# Altium integrated library 860010374011_Altium_WCAP-ATG8_rev19a.IntLib: 195 symbols (part 2 of 2)
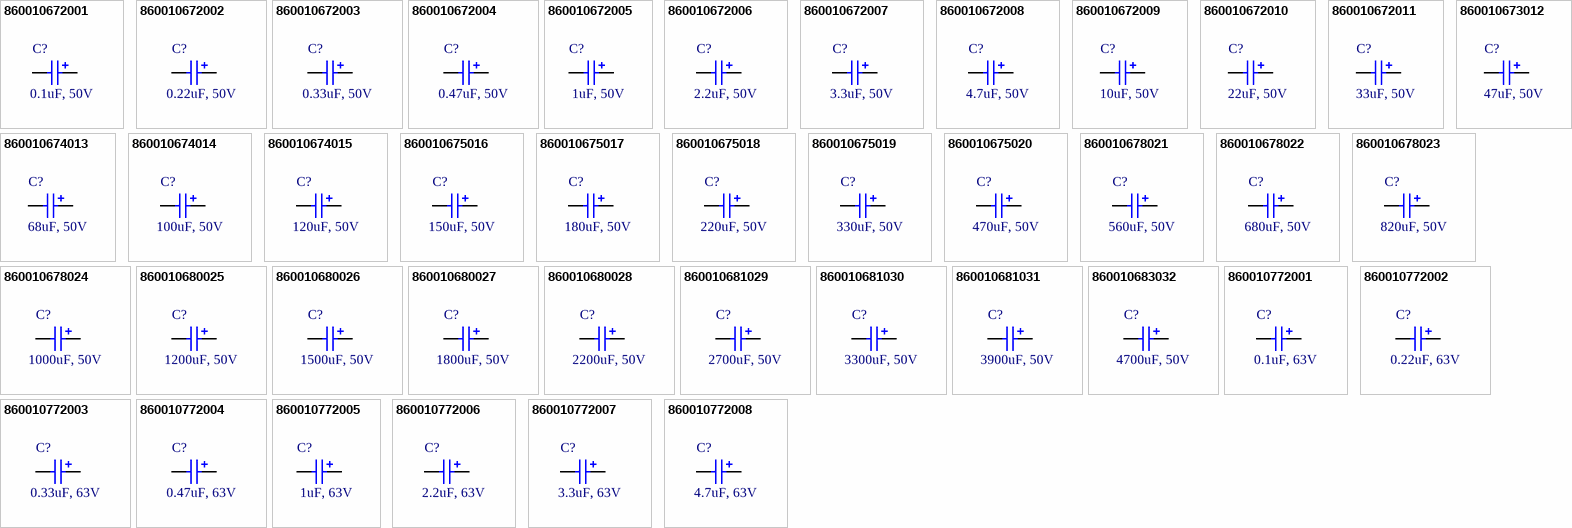
[diagram p5: symbols 860010672001 to 860010772008]

## 860010678024
designator C?, comment 1000uF, 50V
WCAP-ATG8 THT Aluminum Electrolytic Capacitors, D13mm x L25mm, 1000uF, +/-20%, 50VDC; Part Number: 860010678024; Dissipation Factor: 10%; Endurance: 2000h; Leakage Current: 500uA; Ripple Current max.: 1485mA; Technical Reference: ATBI250102M050DSPACB000; ComponentLink1Description: Manufacturer; ComponentLink1URL: http://www.we-online.de; ComponentLink2Description: Datasheet; ComponentLink2URL: https://katalog.we-online.com/pbs/datasheet/860010678024.pdf; Length: 25mm; Mounting Technology: THT; Operating Temperature: -40 to +85degC; Packaging: Ammo Pack; Published Date: August 2019; Capacitance: 1000uF; Diameter: 13mm; Publisher: Wurth Elektronik; Capacitance Tolerance: +/-20%; Rated Voltage: 50VDC
footprint WCAP-ATG8_13x25
pins: 1 N, 2 P

## 860010680025
designator C?, comment 1200uF, 50V
WCAP-ATG8 THT Aluminum Electrolytic Capacitors, D16mm x L25mm, 1200uF, +/-20%, 50VDC; Part Number: 860010680025; Dissipation Factor: 10%; Endurance: 2000h; Leakage Current: 600uA; Ripple Current max.: 1617mA; Technical Reference: ATBK250122M050DSPAEB000; ComponentLink1Description: Manufacturer; ComponentLink1URL: http://www.we-online.de; ComponentLink2Description: Datasheet; ComponentLink2URL: https://katalog.we-online.com/pbs/datasheet/860010680025.pdf; Length: 25mm; Mounting Technology: THT; Operating Temperature: -40 to +85degC; Packaging: Ammo Pack; Published Date: August 2019; Capacitance: 1200uF; Diameter: 16mm; Publisher: Wurth Elektronik; Capacitance Tolerance: +/-20%; Rated Voltage: 50VDC
footprint WCAP-ATG8_16x25
pins: 1 N, 2 P

## 860010680026
designator C?, comment 1500uF, 50V
WCAP-ATG8 THT Aluminum Electrolytic Capacitors, D16mm x L31.5mm, 1500uF, +/-20%, 50VDC; Part Number: 860010680026; Dissipation Factor: 10%; Endurance: 2000h; Leakage Current: 750uA; Ripple Current max.: 1848mA; Technical Reference: ATBK315152M050DSPADB000; ComponentLink1Description: Manufacturer; ComponentLink1URL: http://www.we-online.de; ComponentLink2Description: Datasheet; ComponentLink2URL: https://katalog.we-online.com/pbs/datasheet/860010680026.pdf; Length: 31.5mm; Mounting Technology: THT; Operating Temperature: -40 to +85degC; Packaging: Ammo Pack; Published Date: August 2019; Capacitance: 1500uF; Diameter: 16mm; Publisher: Wurth Elektronik; Capacitance Tolerance: +/-20%; Rated Voltage: 50VDC
footprint WCAP-ATG8_16x31.5
pins: 1 N, 2 P

## 860010680027
designator C?, comment 1800uF, 50V
WCAP-ATG8 THT Aluminum Electrolytic Capacitors, D16mm x L31.5mm, 1800uF, +/-20%, 50VDC; Part Number: 860010680027; Dissipation Factor: 10%; Endurance: 2000h; Leakage Current: 900uA; Ripple Current max.: 2112mA; Technical Reference: ATBK315182M050DSPADB000; ComponentLink1Description: Manufacturer; ComponentLink1URL: http://www.we-online.de; ComponentLink2Description: Datasheet; ComponentLink2URL: https://katalog.we-online.com/pbs/datasheet/860010680027.pdf; Length: 31.5mm; Mounting Technology: THT; Operating Temperature: -40 to +85degC; Packaging: Ammo Pack; Published Date: August 2019; Capacitance: 1800uF; Diameter: 16mm; Publisher: Wurth Elektronik; Capacitance Tolerance: +/-20%; Rated Voltage: 50VDC
footprint WCAP-ATG8_16x31.5
pins: 1 N, 2 P

## 860010680028
designator C?, comment 2200uF, 50V
WCAP-ATG8 THT Aluminum Electrolytic Capacitors, D16mm x L35.5mm, 2200uF, +/-20%, 50VDC; Part Number: 860010680028; Dissipation Factor: 12%; Endurance: 2000h; Leakage Current: 1100uA; Ripple Current max.: 2310mA; Technical Reference: ATBK355222M050DSPADB000; ComponentLink1Description: Manufacturer; ComponentLink1URL: http://www.we-online.de; ComponentLink2Description: Datasheet; ComponentLink2URL: https://katalog.we-online.com/pbs/datasheet/860010680028.pdf; Length: 35.5mm; Mounting Technology: THT; Operating Temperature: -40 to +85degC; Packaging: Ammo Pack; Published Date: August 2019; Capacitance: 2200uF; Diameter: 16mm; Publisher: Wurth Elektronik; Capacitance Tolerance: +/-20%; Rated Voltage: 50VDC
footprint WCAP-ATG8_16x35.5
pins: 1 N, 2 P

## 860010681029
designator C?, comment 2700uF, 50V
WCAP-ATG8 THT Aluminum Electrolytic Capacitors, D18mm x L31.5mm, 2700uF, +/-20%, 50VDC; Part Number: 860010681029; Dissipation Factor: 12%; Endurance: 2000h; Leakage Current: 1350uA; Ripple Current max.: 2420mA; Technical Reference: ATBL315272M050DSPAEB000; ComponentLink1Description: Manufacturer; ComponentLink1URL: http://www.we-online.de; ComponentLink2Description: Datasheet; ComponentLink2URL: https://katalog.we-online.com/pbs/datasheet/860010681029.pdf; Length: 31.5mm; Mounting Technology: THT; Operating Temperature: -40 to +85degC; Packaging: Ammo Pack; Published Date: August 2019; Capacitance: 2700uF; Diameter: 18mm; Publisher: Wurth Elektronik; Capacitance Tolerance: +/-20%; Rated Voltage: 50VDC
footprint WCAP-ATG8_18x31.5
pins: 1 N, 2 P

## 860010681030
designator C?, comment 3300uF, 50V
WCAP-ATG8 THT Aluminum Electrolytic Capacitors, D18mm x L35.5mm, 3300uF, +/-20%, 50VDC; Part Number: 860010681030; Dissipation Factor: 14%; Endurance: 2000h; Leakage Current: 1650uA; Ripple Current max.: 2750mA; Technical Reference: ATBL355332M050DSPAEB000; ComponentLink1Description: Manufacturer; ComponentLink1URL: http://www.we-online.de; ComponentLink2Description: Datasheet; ComponentLink2URL: https://katalog.we-online.com/pbs/datasheet/860010681030.pdf; Length: 35.5mm; Mounting Technology: THT; Operating Temperature: -40 to +85degC; Packaging: Ammo Pack; Published Date: August 2019; Capacitance: 3300uF; Diameter: 18mm; Publisher: Wurth Elektronik; Capacitance Tolerance: +/-20%; Rated Voltage: 50VDC
footprint WCAP-ATG8_18x35.5
pins: 1 N, 2 P

## 860010681031
designator C?, comment 3900uF, 50V
WCAP-ATG8 THT Aluminum Electrolytic Capacitors, D18mm x L41mm, 3900uF, +/-20%, 50VDC; Part Number: 860010681031; Dissipation Factor: 14%; Endurance: 2000h; Leakage Current: 1950uA; Ripple Current max.: 2871mA; Technical Reference: ATBL410392M050DSPS1B000; ComponentLink1Description: Manufacturer; ComponentLink1URL: http://www.we-online.de; ComponentLink2Description: Datasheet; ComponentLink2URL: https://katalog.we-online.com/pbs/datasheet/860010681031.pdf; Length: 41mm; Mounting Technology: THT; Operating Temperature: -40 to +85degC; Packaging: Ammo Pack; Published Date: August 2019; Capacitance: 3900uF; Diameter: 18mm; Publisher: Wurth Elektronik; Capacitance Tolerance: +/-20%; Rated Voltage: 50VDC
footprint WCAP-ATG8_18x41
pins: 1 N, 2 P

## 860010683032
designator C?, comment 4700uF, 50V
WCAP-ATG8 THT Aluminum Electrolytic Capacitors, D22mm x L41mm, 4700uF, +/-20%, 50VDC; Part Number: 860010683032; Dissipation Factor: 16%; Endurance: 2000h; Leakage Current: 2350uA; Ripple Current max.: 3355mA; Technical Reference: ATBN410472M050DSPS2B000; ComponentLink1Description: Manufacturer; ComponentLink1URL: http://www.we-online.de; ComponentLink2Description: Datasheet; ComponentLink2URL: https://katalog.we-online.com/pbs/datasheet/860010683032.pdf; Length: 41mm; Mounting Technology: THT; Operating Temperature: -40 to +85degC; Packaging: Ammo Pack; Published Date: August 2019; Capacitance: 4700uF; Diameter: 22mm; Publisher: Wurth Elektronik; Capacitance Tolerance: +/-20%; Rated Voltage: 50VDC
footprint WCAP-ATG8_22x41
pins: 1 N, 2 P

## 860010772001
designator C?, comment 0.1uF, 63V
WCAP-ATG8 THT Aluminum Electrolytic Capacitors, D5mm x L11mm, 0.1uF, +/-20%, 63VDC; Part Number: 860010772001; Dissipation Factor: 9%; Endurance: 2000h; Leakage Current: 3uA; Ripple Current max.: 4mA; Technical Reference: ATBC110R10M063DSPA3B000; ComponentLink1Description: Manufacturer; ComponentLink1URL: http://www.we-online.de; ComponentLink2Description: Datasheet; ComponentLink2URL: https://katalog.we-online.com/pbs/datasheet/860010772001.pdf; Length: 11mm; Mounting Technology: THT; Operating Temperature: -40 to +85degC; Packaging: Ammo Pack; Published Date: August 2019; Capacitance: 0.1uF; Diameter: 5mm; Publisher: Wurth Elektronik; Capacitance Tolerance: +/-20%; Rated Voltage: 63VDC
footprint WCAP-ATG8_5x11
pins: 1 N, 2 P

## 860010772002
designator C?, comment 0.22uF, 63V
WCAP-ATG8 THT Aluminum Electrolytic Capacitors, D5mm x L11mm, 0.22uF, +/-20%, 63VDC; Part Number: 860010772002; Dissipation Factor: 9%; Endurance: 2000h; Leakage Current: 3uA; Ripple Current max.: 4mA; Technical Reference: ATBC110R22M063DSPA3B000; ComponentLink1Description: Manufacturer; ComponentLink1URL: http://www.we-online.de; ComponentLink2Description: Datasheet; ComponentLink2URL: https://katalog.we-online.com/pbs/datasheet/860010772002.pdf; Length: 11mm; Mounting Technology: THT; Operating Temperature: -40 to +85degC; Packaging: Ammo Pack; Published Date: August 2019; Capacitance: 0.22uF; Diameter: 5mm; Publisher: Wurth Elektronik; Capacitance Tolerance: +/-20%; Rated Voltage: 63VDC
footprint WCAP-ATG8_5x11
pins: 1 N, 2 P

## 860010772003
designator C?, comment 0.33uF, 63V
WCAP-ATG8 THT Aluminum Electrolytic Capacitors, D5mm x L11mm, 0.33uF, +/-20%, 63VDC; Part Number: 860010772003; Dissipation Factor: 9%; Endurance: 2000h; Leakage Current: 3uA; Ripple Current max.: 6mA; Technical Reference: ATBC110R33M063DSPA3B000; ComponentLink1Description: Manufacturer; ComponentLink1URL: http://www.we-online.de; ComponentLink2Description: Datasheet; ComponentLink2URL: https://katalog.we-online.com/pbs/datasheet/860010772003.pdf; Length: 11mm; Mounting Technology: THT; Operating Temperature: -40 to +85degC; Packaging: Ammo Pack; Published Date: August 2019; Capacitance: 0.33uF; Diameter: 5mm; Publisher: Wurth Elektronik; Capacitance Tolerance: +/-20%; Rated Voltage: 63VDC
footprint WCAP-ATG8_5x11
pins: 1 N, 2 P

## 860010772004
designator C?, comment 0.47uF, 63V
WCAP-ATG8 THT Aluminum Electrolytic Capacitors, D5mm x L11mm, 0.47uF, +/-20%, 63VDC; Part Number: 860010772004; Dissipation Factor: 9%; Endurance: 2000h; Leakage Current: 3uA; Ripple Current max.: 8mA; Technical Reference: ATBC110R47M063DSPA3B000; ComponentLink1Description: Manufacturer; ComponentLink1URL: http://www.we-online.de; ComponentLink2Description: Datasheet; ComponentLink2URL: https://katalog.we-online.com/pbs/datasheet/860010772004.pdf; Length: 11mm; Mounting Technology: THT; Operating Temperature: -40 to +85degC; Packaging: Ammo Pack; Published Date: August 2019; Capacitance: 0.47uF; Diameter: 5mm; Publisher: Wurth Elektronik; Capacitance Tolerance: +/-20%; Rated Voltage: 63VDC
footprint WCAP-ATG8_5x11
pins: 1 N, 2 P

## 860010772005
designator C?, comment 1uF, 63V
WCAP-ATG8 THT Aluminum Electrolytic Capacitors, D5mm x L11mm, 1uF, +/-20%, 63VDC; Part Number: 860010772005; Dissipation Factor: 9%; Endurance: 2000h; Leakage Current: 3uA; Ripple Current max.: 17mA; Technical Reference: ATBC110010M063DSPA3B000; ComponentLink1Description: Manufacturer; ComponentLink1URL: http://www.we-online.de; ComponentLink2Description: Datasheet; ComponentLink2URL: https://katalog.we-online.com/pbs/datasheet/860010772005.pdf; Length: 11mm; Mounting Technology: THT; Operating Temperature: -40 to +85degC; Packaging: Ammo Pack; Published Date: August 2019; Capacitance: 1uF; Diameter: 5mm; Publisher: Wurth Elektronik; Capacitance Tolerance: +/-20%; Rated Voltage: 63VDC
footprint WCAP-ATG8_5x11
pins: 1 N, 2 P

## 860010772006
designator C?, comment 2.2uF, 63V
WCAP-ATG8 THT Aluminum Electrolytic Capacitors, D5mm x L11mm, 2.2uF, +/-20%, 63VDC; Part Number: 860010772006; Dissipation Factor: 9%; Endurance: 2000h; Leakage Current: 3uA; Ripple Current max.: 31mA; Technical Reference: ATBC1102R2M063DSPA3B000; ComponentLink1Description: Manufacturer; ComponentLink1URL: http://www.we-online.de; ComponentLink2Description: Datasheet; ComponentLink2URL: https://katalog.we-online.com/pbs/datasheet/860010772006.pdf; Length: 11mm; Mounting Technology: THT; Operating Temperature: -40 to +85degC; Packaging: Ammo Pack; Published Date: August 2019; Capacitance: 2.2uF; Diameter: 5mm; Publisher: Wurth Elektronik; Capacitance Tolerance: +/-20%; Rated Voltage: 63VDC
footprint WCAP-ATG8_5x11
pins: 1 N, 2 P

## 860010772007
designator C?, comment 3.3uF, 63V
WCAP-ATG8 THT Aluminum Electrolytic Capacitors, D5mm x L11mm, 3.3uF, +/-20%, 63VDC; Part Number: 860010772007; Dissipation Factor: 9%; Endurance: 2000h; Leakage Current: 3uA; Ripple Current max.: 39mA; Technical Reference: ATBC1103R3M063DSPA3B000; ComponentLink1Description: Manufacturer; ComponentLink1URL: http://www.we-online.de; ComponentLink2Description: Datasheet; ComponentLink2URL: https://katalog.we-online.com/pbs/datasheet/860010772007.pdf; Length: 11mm; Mounting Technology: THT; Operating Temperature: -40 to +85degC; Packaging: Ammo Pack; Published Date: August 2019; Capacitance: 3.3uF; Diameter: 5mm; Publisher: Wurth Elektronik; Capacitance Tolerance: +/-20%; Rated Voltage: 63VDC
footprint WCAP-ATG8_5x11
pins: 1 N, 2 P

## 860010772008
designator C?, comment 4.7uF, 63V
WCAP-ATG8 THT Aluminum Electrolytic Capacitors, D5mm x L11mm, 4.7uF, +/-20%, 63VDC; Part Number: 860010772008; Dissipation Factor: 9%; Endurance: 2000h; Leakage Current: 3uA; Ripple Current max.: 50mA; Technical Reference: ATBC1104R7M063DSPA3B000; ComponentLink1Description: Manufacturer; ComponentLink1URL: http://www.we-online.de; ComponentLink2Description: Datasheet; ComponentLink2URL: https://katalog.we-online.com/pbs/datasheet/860010772008.pdf; Length: 11mm; Mounting Technology: THT; Operating Temperature: -40 to +85degC; Packaging: Ammo Pack; Published Date: August 2019; Capacitance: 4.7uF; Diameter: 5mm; Publisher: Wurth Elektronik; Capacitance Tolerance: +/-20%; Rated Voltage: 63VDC
footprint WCAP-ATG8_5x11
pins: 1 N, 2 P

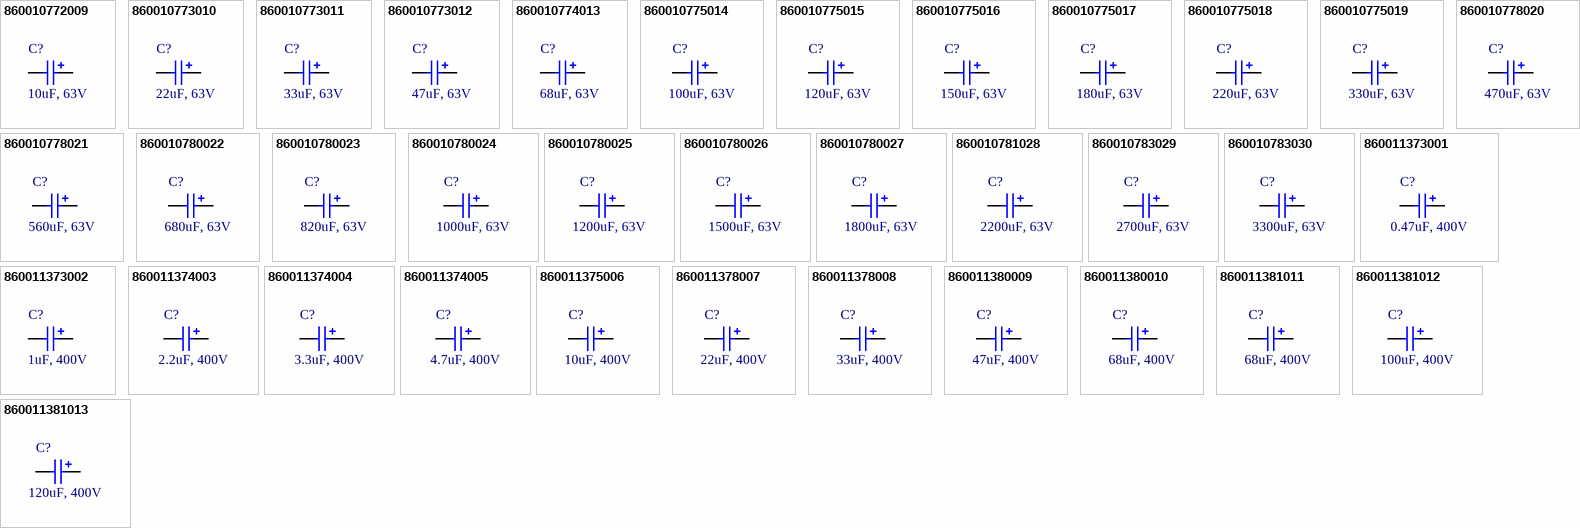
[diagram p4: symbols 860010772009 to 860011381013]

## 860010772009
designator C?, comment 10uF, 63V
WCAP-ATG8 THT Aluminum Electrolytic Capacitors, D5mm x L11mm, 10uF, +/-20%, 63VDC; Part Number: 860010772009; Dissipation Factor: 9%; Endurance: 2000h; Leakage Current: 6.3uA; Ripple Current max.: 77mA; Technical Reference: ATBC110100M063DSPA3B000; ComponentLink1Description: Manufacturer; ComponentLink1URL: http://www.we-online.de; ComponentLink2Description: Datasheet; ComponentLink2URL: https://katalog.we-online.com/pbs/datasheet/860010772009.pdf; Length: 11mm; Mounting Technology: THT; Operating Temperature: -40 to +85degC; Packaging: Ammo Pack; Published Date: August 2019; Capacitance: 10uF; Diameter: 5mm; Publisher: Wurth Elektronik; Capacitance Tolerance: +/-20%; Rated Voltage: 63VDC
footprint WCAP-ATG8_5x11
pins: 1 N, 2 P

## 860010773010
designator C?, comment 22uF, 63V
WCAP-ATG8 THT Aluminum Electrolytic Capacitors, D6.3mm x L11mm, 22uF, +/-20%, 63VDC; Part Number: 860010773010; Dissipation Factor: 9%; Endurance: 2000h; Leakage Current: 13.86uA; Ripple Current max.: 127mA; Technical Reference: ATBD110220M063DSPA4B000; ComponentLink1Description: Manufacturer; ComponentLink1URL: http://www.we-online.de; ComponentLink2Description: Datasheet; ComponentLink2URL: https://katalog.we-online.com/pbs/datasheet/860010773010.pdf; Length: 11mm; Mounting Technology: THT; Operating Temperature: -40 to +85degC; Packaging: Ammo Pack; Published Date: August 2019; Capacitance: 22uF; Diameter: 6.3mm; Publisher: Wurth Elektronik; Capacitance Tolerance: +/-20%; Rated Voltage: 63VDC
footprint WCAP-ATG8_6.3x11
pins: 1 N, 2 P

## 860010773011
designator C?, comment 33uF, 63V
WCAP-ATG8 THT Aluminum Electrolytic Capacitors, D6.3mm x L11mm, 33uF, +/-20%, 63VDC; Part Number: 860010773011; Dissipation Factor: 9%; Endurance: 2000h; Leakage Current: 20.79uA; Ripple Current max.: 149mA; Technical Reference: ATBD110330M063DSPA4B000; ComponentLink1Description: Manufacturer; ComponentLink1URL: http://www.we-online.de; ComponentLink2Description: Datasheet; ComponentLink2URL: https://katalog.we-online.com/pbs/datasheet/860010773011.pdf; Length: 11mm; Mounting Technology: THT; Operating Temperature: -40 to +85degC; Packaging: Ammo Pack; Published Date: August 2019; Capacitance: 33uF; Diameter: 6.3mm; Publisher: Wurth Elektronik; Capacitance Tolerance: +/-20%; Rated Voltage: 63VDC
footprint WCAP-ATG8_6.3x11
pins: 1 N, 2 P

## 860010773012
designator C?, comment 47uF, 63V
WCAP-ATG8 THT Aluminum Electrolytic Capacitors, D6.3mm x L11mm, 47uF, +/-20%, 63VDC; Part Number: 860010773012; Dissipation Factor: 9%; Endurance: 2000h; Leakage Current: 29.61uA; Ripple Current max.: 198mA; Technical Reference: ATBD110470M063DSPA4B000; ComponentLink1Description: Manufacturer; ComponentLink1URL: http://www.we-online.de; ComponentLink2Description: Datasheet; ComponentLink2URL: https://katalog.we-online.com/pbs/datasheet/860010773012.pdf; Length: 11mm; Mounting Technology: THT; Operating Temperature: -40 to +85degC; Packaging: Ammo Pack; Published Date: August 2019; Capacitance: 47uF; Diameter: 6.3mm; Publisher: Wurth Elektronik; Capacitance Tolerance: +/-20%; Rated Voltage: 63VDC
footprint WCAP-ATG8_6.3x11
pins: 1 N, 2 P

## 860010774013
designator C?, comment 68uF, 63V
WCAP-ATG8 THT Aluminum Electrolytic Capacitors, D8mm x L11.5mm, 68uF, +/-20%, 63VDC; Part Number: 860010774013; Dissipation Factor: 9%; Endurance: 2000h; Leakage Current: 42.84uA; Ripple Current max.: 253mA; Technical Reference: ATBE115680M063DSPA7B000; ComponentLink1Description: Manufacturer; ComponentLink1URL: http://www.we-online.de; ComponentLink2Description: Datasheet; ComponentLink2URL: https://katalog.we-online.com/pbs/datasheet/860010774013.pdf; Length: 11.5mm; Mounting Technology: THT; Operating Temperature: -40 to +85degC; Packaging: Ammo Pack; Published Date: August 2019; Capacitance: 68uF; Diameter: 8mm; Publisher: Wurth Elektronik; Capacitance Tolerance: +/-20%; Rated Voltage: 63VDC
footprint WCAP-ATG8_8x11.5
pins: 1 N, 2 P

## 860010775014
designator C?, comment 100uF, 63V
WCAP-ATG8 THT Aluminum Electrolytic Capacitors, D10mm x L12.5mm, 100uF, +/-20%, 63VDC; Part Number: 860010775014; Dissipation Factor: 9%; Endurance: 2000h; Leakage Current: 63uA; Ripple Current max.: 330mA; Technical Reference: ATBF125101M063DSPA9B000; ComponentLink1Description: Manufacturer; ComponentLink1URL: http://www.we-online.de; ComponentLink2Description: Datasheet; ComponentLink2URL: https://katalog.we-online.com/pbs/datasheet/860010775014.pdf; Length: 12.5mm; Mounting Technology: THT; Operating Temperature: -40 to +85degC; Packaging: Ammo Pack; Published Date: August 2019; Capacitance: 100uF; Diameter: 10mm; Publisher: Wurth Elektronik; Capacitance Tolerance: +/-20%; Rated Voltage: 63VDC
footprint WCAP-ATG8_10x12.5
pins: 1 N, 2 P

## 860010775015
designator C?, comment 120uF, 63V
WCAP-ATG8 THT Aluminum Electrolytic Capacitors, D10mm x L16mm, 120uF, +/-20%, 63VDC; Part Number: 860010775015; Dissipation Factor: 9%; Endurance: 2000h; Leakage Current: 75.6uA; Ripple Current max.: 396mA; Technical Reference: ATBF160121M063DSPAAB000; ComponentLink1Description: Manufacturer; ComponentLink1URL: http://www.we-online.de; ComponentLink2Description: Datasheet; ComponentLink2URL: https://katalog.we-online.com/pbs/datasheet/860010775015.pdf; Length: 16mm; Mounting Technology: THT; Operating Temperature: -40 to +85degC; Packaging: Ammo Pack; Published Date: August 2019; Capacitance: 120uF; Diameter: 10mm; Publisher: Wurth Elektronik; Capacitance Tolerance: +/-20%; Rated Voltage: 63VDC
footprint WCAP-ATG8_10x16
pins: 1 N, 2 P

## 860010775016
designator C?, comment 150uF, 63V
WCAP-ATG8 THT Aluminum Electrolytic Capacitors, D10mm x L16mm, 150uF, +/-20%, 63VDC; Part Number: 860010775016; Dissipation Factor: 9%; Endurance: 2000h; Leakage Current: 94.5uA; Ripple Current max.: 462mA; Technical Reference: ATBF160151M063DSPAAB000; ComponentLink1Description: Manufacturer; ComponentLink1URL: http://www.we-online.de; ComponentLink2Description: Datasheet; ComponentLink2URL: https://katalog.we-online.com/pbs/datasheet/860010775016.pdf; Length: 16mm; Mounting Technology: THT; Operating Temperature: -40 to +85degC; Packaging: Ammo Pack; Published Date: August 2019; Capacitance: 150uF; Diameter: 10mm; Publisher: Wurth Elektronik; Capacitance Tolerance: +/-20%; Rated Voltage: 63VDC
footprint WCAP-ATG8_10x16
pins: 1 N, 2 P

## 860010775017
designator C?, comment 180uF, 63V
WCAP-ATG8 THT Aluminum Electrolytic Capacitors, D10mm x L16mm, 180uF, +/-20%, 63VDC; Part Number: 860010775017; Dissipation Factor: 9%; Endurance: 2000h; Leakage Current: 113.4uA; Ripple Current max.: 528mA; Technical Reference: ATBF160181M063DSPAAB000; ComponentLink1Description: Manufacturer; ComponentLink1URL: http://www.we-online.de; ComponentLink2Description: Datasheet; ComponentLink2URL: https://katalog.we-online.com/pbs/datasheet/860010775017.pdf; Length: 16mm; Mounting Technology: THT; Operating Temperature: -40 to +85degC; Packaging: Ammo Pack; Published Date: August 2019; Capacitance: 180uF; Diameter: 10mm; Publisher: Wurth Elektronik; Capacitance Tolerance: +/-20%; Rated Voltage: 63VDC
footprint WCAP-ATG8_10x16
pins: 1 N, 2 P

## 860010775018
designator C?, comment 220uF, 63V
WCAP-ATG8 THT Aluminum Electrolytic Capacitors, D10mm x L16mm, 220uF, +/-20%, 63VDC; Part Number: 860010775018; Dissipation Factor: 9%; Endurance: 2000h; Leakage Current: 138.6uA; Ripple Current max.: 550mA; Technical Reference: ATBF160221M063DSPAAB000; ComponentLink1Description: Manufacturer; ComponentLink1URL: http://www.we-online.de; ComponentLink2Description: Datasheet; ComponentLink2URL: https://katalog.we-online.com/pbs/datasheet/860010775018.pdf; Length: 16mm; Mounting Technology: THT; Operating Temperature: -40 to +85degC; Packaging: Ammo Pack; Published Date: August 2019; Capacitance: 220uF; Diameter: 10mm; Publisher: Wurth Elektronik; Capacitance Tolerance: +/-20%; Rated Voltage: 63VDC
footprint WCAP-ATG8_10x16
pins: 1 N, 2 P

## 860010775019
designator C?, comment 330uF, 63V
WCAP-ATG8 THT Aluminum Electrolytic Capacitors, D10mm x L20mm, 330uF, +/-20%, 63VDC; Part Number: 860010775019; Dissipation Factor: 9%; Endurance: 2000h; Leakage Current: 207.9uA; Ripple Current max.: 759mA; Technical Reference: ATBF200331M063DSPAAB000; ComponentLink1Description: Manufacturer; ComponentLink1URL: http://www.we-online.de; ComponentLink2Description: Datasheet; ComponentLink2URL: https://katalog.we-online.com/pbs/datasheet/860010775019.pdf; Length: 20mm; Mounting Technology: THT; Operating Temperature: -40 to +85degC; Packaging: Ammo Pack; Published Date: August 2019; Capacitance: 330uF; Diameter: 10mm; Publisher: Wurth Elektronik; Capacitance Tolerance: +/-20%; Rated Voltage: 63VDC
footprint WCAP-ATG8_10x20
pins: 1 N, 2 P

## 860010778020
designator C?, comment 470uF, 63V
WCAP-ATG8 THT Aluminum Electrolytic Capacitors, D13mm x L20mm, 470uF, +/-20%, 63VDC; Part Number: 860010778020; Dissipation Factor: 9%; Endurance: 2000h; Leakage Current: 296.1uA; Ripple Current max.: 968mA; Technical Reference: ATBI200471M063DSPACB000; ComponentLink1Description: Manufacturer; ComponentLink1URL: http://www.we-online.de; ComponentLink2Description: Datasheet; ComponentLink2URL: https://katalog.we-online.com/pbs/datasheet/860010778020.pdf; Length: 20mm; Mounting Technology: THT; Operating Temperature: -40 to +85degC; Packaging: Ammo Pack; Published Date: August 2019; Capacitance: 470uF; Diameter: 13mm; Publisher: Wurth Elektronik; Capacitance Tolerance: +/-20%; Rated Voltage: 63VDC
footprint WCAP-ATG8_13x20
pins: 1 N, 2 P

## 860010778021
designator C?, comment 560uF, 63V
WCAP-ATG8 THT Aluminum Electrolytic Capacitors, D13mm x L25mm, 560uF, +/-20%, 63VDC; Part Number: 860010778021; Dissipation Factor: 9%; Endurance: 2000h; Leakage Current: 352.8uA; Ripple Current max.: 1056mA; Technical Reference: ATBI250561M063DSPACB000; ComponentLink1Description: Manufacturer; ComponentLink1URL: http://www.we-online.de; ComponentLink2Description: Datasheet; ComponentLink2URL: https://katalog.we-online.com/pbs/datasheet/860010778021.pdf; Length: 25mm; Mounting Technology: THT; Operating Temperature: -40 to +85degC; Packaging: Ammo Pack; Published Date: August 2019; Capacitance: 560uF; Diameter: 13mm; Publisher: Wurth Elektronik; Capacitance Tolerance: +/-20%; Rated Voltage: 63VDC
footprint WCAP-ATG8_13x25
pins: 1 N, 2 P

## 860010780022
designator C?, comment 680uF, 63V
WCAP-ATG8 THT Aluminum Electrolytic Capacitors, D16mm x L25mm, 680uF, +/-20%, 63VDC; Part Number: 860010780022; Dissipation Factor: 9%; Endurance: 2000h; Leakage Current: 428.4uA; Ripple Current max.: 1265mA; Technical Reference: ATBK250681M063DSPAEB000; ComponentLink1Description: Manufacturer; ComponentLink1URL: http://www.we-online.de; ComponentLink2Description: Datasheet; ComponentLink2URL: https://katalog.we-online.com/pbs/datasheet/860010780022.pdf; Length: 25mm; Mounting Technology: THT; Operating Temperature: -40 to +85degC; Packaging: Ammo Pack; Published Date: August 2019; Capacitance: 680uF; Diameter: 16mm; Publisher: Wurth Elektronik; Capacitance Tolerance: +/-20%; Rated Voltage: 63VDC
footprint WCAP-ATG8_16x25
pins: 1 N, 2 P

## 860010780023
designator C?, comment 820uF, 63V
WCAP-ATG8 THT Aluminum Electrolytic Capacitors, D16mm x L25mm, 820uF, +/-20%, 63VDC; Part Number: 860010780023; Dissipation Factor: 9%; Endurance: 2000h; Leakage Current: 516.6uA; Ripple Current max.: 1430mA; Technical Reference: ATBK250821M063DSPAEB000; ComponentLink1Description: Manufacturer; ComponentLink1URL: http://www.we-online.de; ComponentLink2Description: Datasheet; ComponentLink2URL: https://katalog.we-online.com/pbs/datasheet/860010780023.pdf; Length: 25mm; Mounting Technology: THT; Operating Temperature: -40 to +85degC; Packaging: Ammo Pack; Published Date: August 2019; Capacitance: 820uF; Diameter: 16mm; Publisher: Wurth Elektronik; Capacitance Tolerance: +/-20%; Rated Voltage: 63VDC
footprint WCAP-ATG8_16x25
pins: 1 N, 2 P

## 860010780024
designator C?, comment 1000uF, 63V
WCAP-ATG8 THT Aluminum Electrolytic Capacitors, D16mm x L25mm, 1000uF, +/-20%, 63VDC; Part Number: 860010780024; Dissipation Factor: 9%; Endurance: 2000h; Leakage Current: 630uA; Ripple Current max.: 1540mA; Technical Reference: ATBK250102M063DSPAEB000; ComponentLink1Description: Manufacturer; ComponentLink1URL: http://www.we-online.de; ComponentLink2Description: Datasheet; ComponentLink2URL: https://katalog.we-online.com/pbs/datasheet/860010780024.pdf; Length: 25mm; Mounting Technology: THT; Operating Temperature: -40 to +85degC; Packaging: Ammo Pack; Published Date: August 2019; Capacitance: 1000uF; Diameter: 16mm; Publisher: Wurth Elektronik; Capacitance Tolerance: +/-20%; Rated Voltage: 63VDC
footprint WCAP-ATG8_16x25
pins: 1 N, 2 P

## 860010780025
designator C?, comment 1200uF, 63V
WCAP-ATG8 THT Aluminum Electrolytic Capacitors, D16mm x L31.5mm, 1200uF, +/-20%, 63VDC; Part Number: 860010780025; Dissipation Factor: 9%; Endurance: 2000h; Leakage Current: 756uA; Ripple Current max.: 1837mA; Technical Reference: ATBK315122M063DSPADB000; ComponentLink1Description: Manufacturer; ComponentLink1URL: http://www.we-online.de; ComponentLink2Description: Datasheet; ComponentLink2URL: https://katalog.we-online.com/pbs/datasheet/860010780025.pdf; Length: 31.5mm; Mounting Technology: THT; Operating Temperature: -40 to +85degC; Packaging: Ammo Pack; Published Date: August 2019; Capacitance: 1200uF; Diameter: 16mm; Publisher: Wurth Elektronik; Capacitance Tolerance: +/-20%; Rated Voltage: 63VDC
footprint WCAP-ATG8_16x31.5
pins: 1 N, 2 P

## 860010780026
designator C?, comment 1500uF, 63V
WCAP-ATG8 THT Aluminum Electrolytic Capacitors, D16mm x L35.5mm, 1500uF, +/-20%, 63VDC; Part Number: 860010780026; Dissipation Factor: 9%; Endurance: 2000h; Leakage Current: 945uA; Ripple Current max.: 2090mA; Technical Reference: ATBK355152M063DSPADB000; ComponentLink1Description: Manufacturer; ComponentLink1URL: http://www.we-online.de; ComponentLink2Description: Datasheet; ComponentLink2URL: https://katalog.we-online.com/pbs/datasheet/860010780026.pdf; Length: 35.5mm; Mounting Technology: THT; Operating Temperature: -40 to +85degC; Packaging: Ammo Pack; Published Date: August 2019; Capacitance: 1500uF; Diameter: 16mm; Publisher: Wurth Elektronik; Capacitance Tolerance: +/-20%; Rated Voltage: 63VDC
footprint WCAP-ATG8_16x35.5
pins: 1 N, 2 P

## 860010780027
designator C?, comment 1800uF, 63V
WCAP-ATG8 THT Aluminum Electrolytic Capacitors, D16mm x L35.5mm, 1800uF, +/-20%, 63VDC; Part Number: 860010780027; Dissipation Factor: 9%; Endurance: 2000h; Leakage Current: 1134uA; Ripple Current max.: 2255mA; Technical Reference: ATBK355182M063DSPADB000; ComponentLink1Description: Manufacturer; ComponentLink1URL: http://www.we-online.de; ComponentLink2Description: Datasheet; ComponentLink2URL: https://katalog.we-online.com/pbs/datasheet/860010780027.pdf; Length: 35.5mm; Mounting Technology: THT; Operating Temperature: -40 to +85degC; Packaging: Ammo Pack; Published Date: August 2019; Capacitance: 1800uF; Diameter: 16mm; Publisher: Wurth Elektronik; Capacitance Tolerance: +/-20%; Rated Voltage: 63VDC
footprint WCAP-ATG8_16x35.5
pins: 1 N, 2 P

## 860010781028
designator C?, comment 2200uF, 63V
WCAP-ATG8 THT Aluminum Electrolytic Capacitors, D18mm x L35.5mm, 2200uF, +/-20%, 63VDC; Part Number: 860010781028; Dissipation Factor: 11%; Endurance: 2000h; Leakage Current: 1386uA; Ripple Current max.: 2475mA; Technical Reference: ATBL355222M063DSPAEB000; ComponentLink1Description: Manufacturer; ComponentLink1URL: http://www.we-online.de; ComponentLink2Description: Datasheet; ComponentLink2URL: https://katalog.we-online.com/pbs/datasheet/860010781028.pdf; Length: 35.5mm; Mounting Technology: THT; Operating Temperature: -40 to +85degC; Packaging: Ammo Pack; Published Date: August 2019; Capacitance: 2200uF; Diameter: 18mm; Publisher: Wurth Elektronik; Capacitance Tolerance: +/-20%; Rated Voltage: 63VDC
footprint WCAP-ATG8_18x35.5
pins: 1 N, 2 P

## 860010783029
designator C?, comment 2700uF, 63V
WCAP-ATG8 THT Aluminum Electrolytic Capacitors, D22mm x L41mm, 2700uF, +/-20%, 63VDC; Part Number: 860010783029; Dissipation Factor: 11%; Endurance: 2000h; Leakage Current: 1701uA; Ripple Current max.: 2860mA; Technical Reference: ATBN410272M063DSPS2B000; ComponentLink1Description: Manufacturer; ComponentLink1URL: http://www.we-online.de; ComponentLink2Description: Datasheet; ComponentLink2URL: https://katalog.we-online.com/pbs/datasheet/860010783029.pdf; Length: 41mm; Mounting Technology: THT; Operating Temperature: -40 to +85degC; Packaging: Ammo Pack; Published Date: August 2019; Capacitance: 2700uF; Diameter: 22mm; Publisher: Wurth Elektronik; Capacitance Tolerance: +/-20%; Rated Voltage: 63VDC
footprint WCAP-ATG8_22x41
pins: 1 N, 2 P

## 860010783030
designator C?, comment 3300uF, 63V
WCAP-ATG8 THT Aluminum Electrolytic Capacitors, D22mm x L41mm, 3300uF, +/-20%, 63VDC; Part Number: 860010783030; Dissipation Factor: 13%; Endurance: 2000h; Leakage Current: 2079uA; Ripple Current max.: 3080mA; Technical Reference: ATBN410332M063DSPS2B000; ComponentLink1Description: Manufacturer; ComponentLink1URL: http://www.we-online.de; ComponentLink2Description: Datasheet; ComponentLink2URL: https://katalog.we-online.com/pbs/datasheet/860010783030.pdf; Length: 41mm; Mounting Technology: THT; Operating Temperature: -40 to +85degC; Packaging: Ammo Pack; Published Date: August 2019; Capacitance: 3300uF; Diameter: 22mm; Publisher: Wurth Elektronik; Capacitance Tolerance: +/-20%; Rated Voltage: 63VDC
footprint WCAP-ATG8_22x41
pins: 1 N, 2 P

## 860011373001
designator C?, comment 0.47uF, 400V
WCAP-ATG8 THT Aluminum Electrolytic Capacitors, D6.3mm x L11mm, 0.47uF, +/-20%, 400VDC; Part Number: 860011373001; Dissipation Factor: 15%; Endurance: 2000h; Leakage Current: 5.64uA; Ripple Current max.: 12mA; Technical Reference: ATAD110R47M400DSPA4B000; ComponentLink1Description: Manufacturer; ComponentLink1URL: http://www.we-online.de; ComponentLink2Description: Datasheet; ComponentLink2URL: https://katalog.we-online.com/pbs/datasheet/860011373001.pdf; Length: 11mm; Mounting Technology: THT; Operating Temperature: -25 to +85degC; Packaging: Ammo Pack; Published Date: August 2019; Capacitance: 0.47uF; Diameter: 6.3mm; Publisher: Wurth Elektronik; Capacitance Tolerance: +/-20%; Rated Voltage: 400VDC
footprint WCAP-ATG8_6.3x11
pins: 1 N, 2 P

## 860011373002
designator C?, comment 1uF, 400V
WCAP-ATG8 THT Aluminum Electrolytic Capacitors, D6.3mm x L11mm, 1uF, +/-20%, 400VDC; Part Number: 860011373002; Dissipation Factor: 15%; Endurance: 2000h; Leakage Current: 12uA; Ripple Current max.: 20mA; Technical Reference: ATAD110010M400DSPA4B000; ComponentLink1Description: Manufacturer; ComponentLink1URL: http://www.we-online.de; ComponentLink2Description: Datasheet; ComponentLink2URL: https://katalog.we-online.com/pbs/datasheet/860011373002.pdf; Length: 11mm; Mounting Technology: THT; Operating Temperature: -25 to +85degC; Packaging: Ammo Pack; Published Date: August 2019; Capacitance: 1uF; Diameter: 6.3mm; Publisher: Wurth Elektronik; Capacitance Tolerance: +/-20%; Rated Voltage: 400VDC
footprint WCAP-ATG8_6.3x11
pins: 1 N, 2 P

## 860011374003
designator C?, comment 2.2uF, 400V
WCAP-ATG8 THT Aluminum Electrolytic Capacitors, D8mm x L11.5mm, 2.2uF, +/-20%, 400VDC; Part Number: 860011374003; Dissipation Factor: 15%; Endurance: 2000h; Leakage Current: 26.4uA; Ripple Current max.: 32mA; Technical Reference: ATAE1152R2M400DSPA7B000; ComponentLink1Description: Manufacturer; ComponentLink1URL: http://www.we-online.de; ComponentLink2Description: Datasheet; ComponentLink2URL: https://katalog.we-online.com/pbs/datasheet/860011374003.pdf; Length: 11.5mm; Mounting Technology: THT; Operating Temperature: -25 to +85degC; Packaging: Ammo Pack; Published Date: August 2019; Capacitance: 2.2uF; Diameter: 8mm; Publisher: Wurth Elektronik; Capacitance Tolerance: +/-20%; Rated Voltage: 400VDC
footprint WCAP-ATG8_8x11.5
pins: 1 N, 2 P

## 860011374004
designator C?, comment 3.3uF, 400V
WCAP-ATG8 THT Aluminum Electrolytic Capacitors, D8mm x L11.5mm, 3.3uF, +/-20%, 400VDC; Part Number: 860011374004; Dissipation Factor: 15%; Endurance: 2000h; Leakage Current: 39.6uA; Ripple Current max.: 45mA; Technical Reference: ATAE1153R3M400DSPA7B000; ComponentLink1Description: Manufacturer; ComponentLink1URL: http://www.we-online.de; ComponentLink2Description: Datasheet; ComponentLink2URL: https://katalog.we-online.com/pbs/datasheet/860011374004.pdf; Length: 11.5mm; Mounting Technology: THT; Operating Temperature: -25 to +85degC; Packaging: Ammo Pack; Published Date: August 2019; Capacitance: 3.3uF; Diameter: 8mm; Publisher: Wurth Elektronik; Capacitance Tolerance: +/-20%; Rated Voltage: 400VDC
footprint WCAP-ATG8_8x11.5
pins: 1 N, 2 P

## 860011374005
designator C?, comment 4.7uF, 400V
WCAP-ATG8 THT Aluminum Electrolytic Capacitors, D8mm x L11.5mm, 4.7uF, +/-20%, 400VDC; Part Number: 860011374005; Dissipation Factor: 15%; Endurance: 2000h; Leakage Current: 56.4uA; Ripple Current max.: 55mA; Technical Reference: ATAE1154R7M400DSPA7B000; ComponentLink1Description: Manufacturer; ComponentLink1URL: http://www.we-online.de; ComponentLink2Description: Datasheet; ComponentLink2URL: https://katalog.we-online.com/pbs/datasheet/860011374005.pdf; Length: 11.5mm; Mounting Technology: THT; Operating Temperature: -25 to +85degC; Packaging: Ammo Pack; Published Date: August 2019; Capacitance: 4.7uF; Diameter: 8mm; Publisher: Wurth Elektronik; Capacitance Tolerance: +/-20%; Rated Voltage: 400VDC
footprint WCAP-ATG8_8x11.5
pins: 1 N, 2 P

## 860011375006
designator C?, comment 10uF, 400V
WCAP-ATG8 THT Aluminum Electrolytic Capacitors, D10mm x L16mm, 10uF, +/-20%, 400VDC; Part Number: 860011375006; Dissipation Factor: 15%; Endurance: 2000h; Leakage Current: 120uA; Ripple Current max.: 100mA; Technical Reference: ATAF160100M400DSPAAB000; ComponentLink1Description: Manufacturer; ComponentLink1URL: http://www.we-online.de; ComponentLink2Description: Datasheet; ComponentLink2URL: https://katalog.we-online.com/pbs/datasheet/860011375006.pdf; Length: 16mm; Mounting Technology: THT; Operating Temperature: -25 to +85degC; Packaging: Ammo Pack; Published Date: August 2019; Capacitance: 10uF; Diameter: 10mm; Publisher: Wurth Elektronik; Capacitance Tolerance: +/-20%; Rated Voltage: 400VDC
footprint WCAP-ATG8_10x16
pins: 1 N, 2 P

## 860011378007
designator C?, comment 22uF, 400V
WCAP-ATG8 THT Aluminum Electrolytic Capacitors, D13mm x L20mm, 22uF, +/-20%, 400VDC; Part Number: 860011378007; Dissipation Factor: 15%; Endurance: 2000h; Leakage Current: 264uA; Ripple Current max.: 190mA; Technical Reference: ATAI200220M400DSPACB000; ComponentLink1Description: Manufacturer; ComponentLink1URL: http://www.we-online.de; ComponentLink2Description: Datasheet; ComponentLink2URL: https://katalog.we-online.com/pbs/datasheet/860011378007.pdf; Length: 20mm; Mounting Technology: THT; Operating Temperature: -25 to +85degC; Packaging: Ammo Pack; Published Date: August 2019; Capacitance: 22uF; Diameter: 13mm; Publisher: Wurth Elektronik; Capacitance Tolerance: +/-20%; Rated Voltage: 400VDC
footprint WCAP-ATG8_13x20
pins: 1 N, 2 P

## 860011378008
designator C?, comment 33uF, 400V
WCAP-ATG8 THT Aluminum Electrolytic Capacitors, D13mm x L25mm, 33uF, +/-20%, 400VDC; Part Number: 860011378008; Dissipation Factor: 15%; Endurance: 2000h; Leakage Current: 396uA; Ripple Current max.: 230mA; Technical Reference: ATAI250330M400DSPACB000; ComponentLink1Description: Manufacturer; ComponentLink1URL: http://www.we-online.de; ComponentLink2Description: Datasheet; ComponentLink2URL: https://katalog.we-online.com/pbs/datasheet/860011378008.pdf; Length: 25mm; Mounting Technology: THT; Operating Temperature: -25 to +85degC; Packaging: Ammo Pack; Published Date: August 2019; Capacitance: 33uF; Diameter: 13mm; Publisher: Wurth Elektronik; Capacitance Tolerance: +/-20%; Rated Voltage: 400VDC
footprint WCAP-ATG8_13x25
pins: 1 N, 2 P

## 860011380009
designator C?, comment 47uF, 400V
WCAP-ATG8 THT Aluminum Electrolytic Capacitors, D16mm x L25mm, 47uF, +/-20%, 400VDC; Part Number: 860011380009; Dissipation Factor: 15%; Endurance: 2000h; Leakage Current: 564uA; Ripple Current max.: 270mA; Technical Reference: ATAK250470M400DSPAEB000; ComponentLink1Description: Manufacturer; ComponentLink1URL: http://www.we-online.de; ComponentLink2Description: Datasheet; ComponentLink2URL: https://katalog.we-online.com/pbs/datasheet/860011380009.pdf; Length: 25mm; Mounting Technology: THT; Operating Temperature: -25 to +85degC; Packaging: Ammo Pack; Published Date: August 2019; Capacitance: 47uF; Diameter: 16mm; Publisher: Wurth Elektronik; Capacitance Tolerance: +/-20%; Rated Voltage: 400VDC
footprint WCAP-ATG8_16x25
pins: 1 N, 2 P

## 860011380010
designator C?, comment 68uF, 400V
WCAP-ATG8 THT Aluminum Electrolytic Capacitors, D16mm x L35.5mm, 68uF, +/-20%, 400VDC; Part Number: 860011380010; Dissipation Factor: 15%; Endurance: 2000h; Leakage Current: 816uA; Ripple Current max.: 410mA; Technical Reference: ATAK355680M400DSPADB000; ComponentLink1Description: Manufacturer; ComponentLink1URL: http://www.we-online.de; ComponentLink2Description: Datasheet; ComponentLink2URL: https://katalog.we-online.com/pbs/datasheet/860011380010.pdf; Length: 35.5mm; Mounting Technology: THT; Operating Temperature: -25 to +85degC; Packaging: Ammo Pack; Published Date: August 2019; Capacitance: 68uF; Diameter: 16mm; Publisher: Wurth Elektronik; Capacitance Tolerance: +/-20%; Rated Voltage: 400VDC
footprint WCAP-ATG8_16x35.5
pins: 1 N, 2 P

## 860011381011
designator C?, comment 68uF, 400V
WCAP-ATG8 THT Aluminum Electrolytic Capacitors, D18mm x L25mm, 68uF, +/-20%, 400VDC; Part Number: 860011381011; Dissipation Factor: 15%; Endurance: 2000h; Leakage Current: 816uA; Ripple Current max.: 380mA; Technical Reference: ATAL250680M400DSPAEB000; ComponentLink1Description: Manufacturer; ComponentLink1URL: http://www.we-online.de; ComponentLink2Description: Datasheet; ComponentLink2URL: https://katalog.we-online.com/pbs/datasheet/860011381011.pdf; Length: 25mm; Mounting Technology: THT; Operating Temperature: -25 to +85degC; Packaging: Ammo Pack; Published Date: August 2019; Capacitance: 68uF; Diameter: 18mm; Publisher: Wurth Elektronik; Capacitance Tolerance: +/-20%; Rated Voltage: 400VDC
footprint WCAP-ATG8_18x25
pins: 1 N, 2 P

## 860011381012
designator C?, comment 100uF, 400V
WCAP-ATG8 THT Aluminum Electrolytic Capacitors, D18mm x L31.5mm, 100uF, +/-20%, 400VDC; Part Number: 860011381012; Dissipation Factor: 15%; Endurance: 2000h; Leakage Current: 1200uA; Ripple Current max.: 440mA; Technical Reference: ATAL315101M400DSPAEB000; ComponentLink1Description: Manufacturer; ComponentLink1URL: http://www.we-online.de; ComponentLink2Description: Datasheet; ComponentLink2URL: https://katalog.we-online.com/pbs/datasheet/860011381012.pdf; Length: 31.5mm; Mounting Technology: THT; Operating Temperature: -25 to +85degC; Packaging: Ammo Pack; Published Date: August 2019; Capacitance: 100uF; Diameter: 18mm; Publisher: Wurth Elektronik; Capacitance Tolerance: +/-20%; Rated Voltage: 400VDC
footprint WCAP-ATG8_18x31.5
pins: 1 N, 2 P

## 860011381013
designator C?, comment 120uF, 400V
WCAP-ATG8 THT Aluminum Electrolytic Capacitors, D18mm x L41mm, 120uF, +/-20%, 400VDC; Part Number: 860011381013; Dissipation Factor: 15%; Endurance: 2000h; Leakage Current: 1440uA; Ripple Current max.: 520mA; Technical Reference: ATAL410121M400DSPS1B000; ComponentLink1Description: Manufacturer; ComponentLink1URL: http://www.we-online.de; ComponentLink2Description: Datasheet; ComponentLink2URL: https://katalog.we-online.com/pbs/datasheet/860011381013.pdf; Length: 41mm; Mounting Technology: THT; Operating Temperature: -25 to +85degC; Packaging: Ammo Pack; Published Date: August 2019; Capacitance: 120uF; Diameter: 18mm; Publisher: Wurth Elektronik; Capacitance Tolerance: +/-20%; Rated Voltage: 400VDC
footprint WCAP-ATG8_18x41
pins: 1 N, 2 P